# Altium footprint library heromap.PcbLib: 593 footprints (part 23 of 38)
Each footprint in its own frame and in the unit in brackets; x right, y up, seen from the top. Pads: shape width x height; smd on the part's side, far side on the other; paste and mask are expansions set on the pad; w line width, h text height; cw(c..) or ccw(c..) is an arc to the next point about the centre after c.
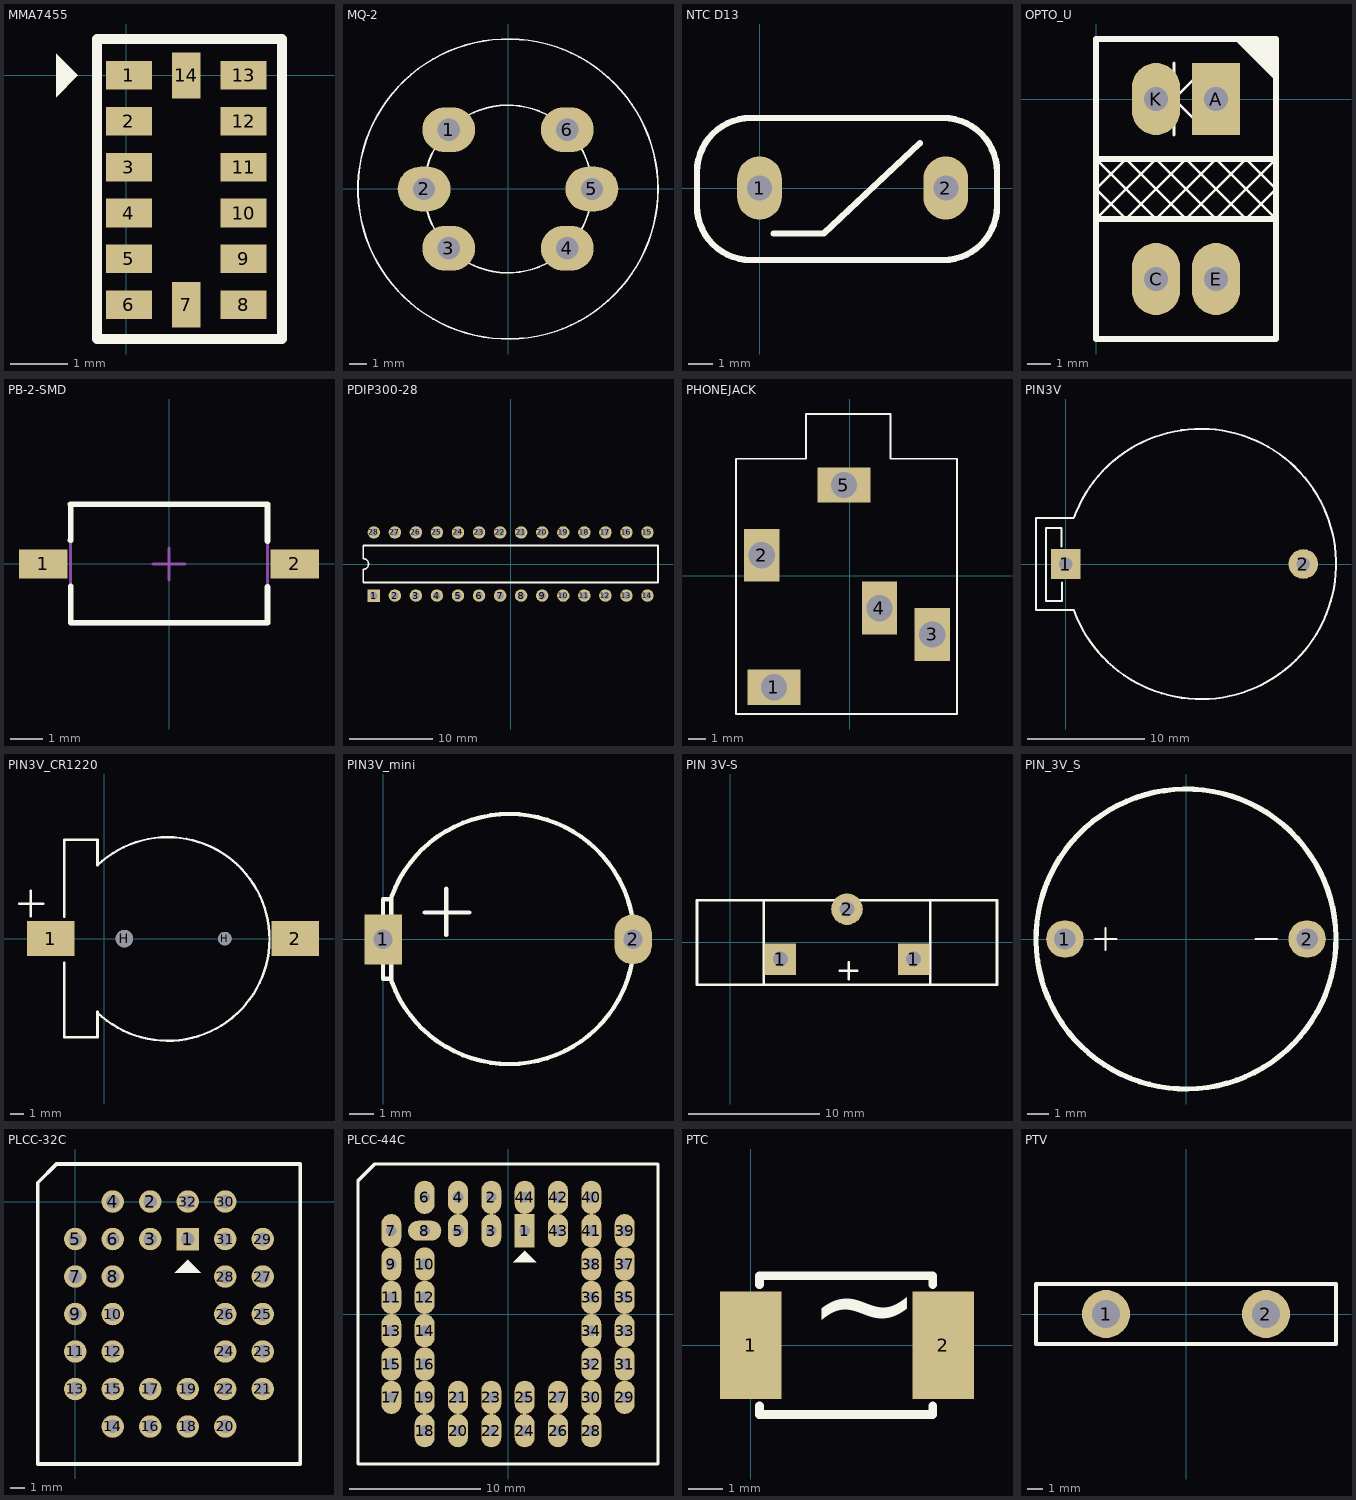
[diagram p22: the footprints below, top view; thin cyan lines are the x and y axes]

## MMA7455 [mm]
pads (14):
  rect 0.8x0.5 smd: 1(0.051,0) 2(0.051,-0.8) 3(0.051,-1.6) 4(0.051,-2.4) 5(0.051,-3.2) 6(0.051,-4) 8(2.051,-4) 9(2.051,-3.2) 10(2.051,-2.4) 11(2.051,-1.6) 12(2.051,-0.8) 13(2.051,0)
  rect 0.5x0.8 smd: 7(1.051,-4) 14(1.051,0)
Top Overlay:
  region: -1.219,0.381 -0.838,0 -1.219,-0.381
  lines w0.178: -0.508,-4.572 -0.508,0.635 2.718,0.635 2.718,-4.597 ; 2.718,-4.597 -0.508,-4.597 2.718,-4.597

## MQ-2 [mm] "MQ-2 GAS SENSOR"
height 20.32
pads (6):
  oval 3x2.54 hole 1.25: 1(-3.359,3.359) 2(-4.75,0) 3(-3.359,-3.359) 4(3.359,-3.359) 5(4.75,0) 6(3.359,3.359)
Top Overlay:
  circle w0.1: c0,0 r8.5
  circle w0.1: c0,0 r4.75
3D body: height 8.7, standoff 0.5, extent -4.762,-4.791 4.8,4.791
3D body: height 16.7, standoff 0.2, extent -4.713,-4.741 4.75,4.74
3D body: height 6.3, standoff 0.1, extent -8.433,-8.483 8.5,8.483
3D body: height 0.4, standoff -2.3, extent -3.855,2.86 -2.859,3.858
3D body: height 0.4, standoff -2.3, extent -5.258,-0.499 -4.262,0.499
3D body: height 0.4, standoff -2.3, extent -3.855,-3.858 -2.859,-2.86
3D body: height 0.4, standoff -2.3, extent 2.863,-3.858 3.859,-2.86
3D body: height 0.4, standoff -2.3, extent 4.254,-0.499 5.25,0.499
3D body: height 0.4, standoff -2.3, extent 2.863,2.86 3.859,3.858

## NTC D13 [mm]
pads (2):
  oval 1.8x2.54 hole 1: 1(0,0) 2(7.493,0)
Top Overlay:
  lines w0.254: 0.559,-1.829 2.591,-1.829 6.452,1.803 ; -2.515,-0.728 ccw(c-0.347,-0.728) -1.88,-2.261 ccw(c-0.347,-0.728) -0.347,-2.896 7.382,-2.896 ccw(c7.382,-0.728) 8.915,-2.261 ccw(c7.382,-0.728) 9.55,-0.728 9.55,0.651 ccw(c7.382,0.651) 8.915,2.184 ccw(c7.382,0.651) 7.382,2.819 0.025,2.819 -0.347,2.819 ccw(c-0.347,0.651) -1.88,2.184 ccw(c-0.347,0.651) -2.515,0.651 -2.515,-0.728
3D body "SW3dPS-B57237.STEP": height 27.5, standoff -24.48, extent -3.715,-3.52 11.285,3.48

## OPTO_U [mil] "Opto hinh chu U"
height 104.33
pads (4):
  rect 80x120 hole 40: A(200,0)
  oval 80x120 hole 40: C(100,-300) E(200,-300) K(100,0)
Top Overlay:
  region: 297.5,97.5 232.5,97.5 297.5,32.5
  lines w5: 0,-200 50,-150 100,-100 200,-200 230,-170 300,-100 300,-200 200,-100 100,-200 90,-190 60,-160 0,-100 ; 130,-60 130,60 ; 180,-50 180,50 ; 180,-50 180,50 ; 180,-50 130,0 180,50 ; 0,-150 30,-180 50,-200 150,-100 250,-200 300,-150 250,-100 150,-200 50,-100 0,-150
  lines w10: 0,-200 300,-200 ; 0,-150 0,-110 ; 0,-100 300,-100 ; 300,-150 300,-140 ; 0,-400 300,-400 300,100 0,100 0,-400
3D body "SW3dPS-optek opb620.STEP": height 374.02, standoff -100, extent 43.46,-346.85 260,46.85

## PB-2-SMD [mm]
height 3.7
pads (2):
  rect 1.5x0.9 smd: 1(-3.9,0) 2(3.9,0)
Top Overlay:
  lines w0.178: -3.05,0.737 -3.048,0.739 -3.048,1.85 ; -3.05,1.85 3.05,1.85 3.05,0.711 ; -3.048,-0.686 -3.048,-1.825 3.052,-1.825 ; 3.05,-1.825 3.05,-0.713 3.052,-0.711
Mechanical 13:
  lines w0.1: -3.048,-1.825 3.052,-1.825 ; -3.05,-1.85 -3.05,1.85 3.05,1.85 3.05,-1.85 -3.05,-1.85
Mechanical 15:
  lines w0.1: -0.5,0 0.5,0 ; 0,-0.5 0,0.5
3D body: height 0.2, standoff 0, extent 3.505,-0.356 4.343,0.356
3D body: height 0.95, standoff 0.75, extent 2.921,-0.356 3.759,0.356
3D body: height 0.95, standoff 0, extent 3.505,-0.356 3.759,0.356
3D body: height 0.95, standoff 0, extent -3.759,-0.356 -3.505,0.356
3D body: height 0.95, standoff 0.75, extent -3.759,-0.356 -2.921,0.356
3D body: height 0.2, standoff 0, extent -4.343,-0.356 -3.505,0.356
3D body: height 1.4, standoff 0, extent -3.05,-1.85 3.05,1.85
3D body: height 1.95, standoff 0.1, extent -2.31,-1.291 2.415,1.321
3D body: height 2.5, standoff 0.1, extent -1.841,-0.842 1.943,0.842

## PDIP300-28 [mm] "DIP, Plastic, Skinny; 28 Leads; Row Spacing 7.62 mm; Pitch 2.54 mm"
height 4.07
pads (28):
  rect 1.5x1.5 hole 0.9: 1(-16.51,-3.81)
  round 1.5 hole 0.9: 2(-13.97,-3.81) 3(-11.43,-3.81) 4(-8.89,-3.81) 5(-6.35,-3.81) 6(-3.81,-3.81) 7(-1.27,-3.81) 8(1.27,-3.81) 9(3.81,-3.81) 10(6.35,-3.81) 11(8.89,-3.81) 12(11.43,-3.81) 13(13.97,-3.81) 14(16.51,-3.81) 15(16.51,3.81) 16(13.97,3.81) 17(11.43,3.81) 18(8.89,3.81) 19(6.35,3.81) 20(3.81,3.81) 21(1.27,3.81) 22(-1.27,3.81) 23(-3.81,3.81) 24(-6.35,3.81) 25(-8.89,3.81) 26(-11.43,3.81) 27(-13.97,3.81) 28(-16.51,3.81)
Top Overlay:
  lines w0.2: -17.78,-2.225 -17.78,-0.635 ccw(c-17.78,0) -17.78,0.635 -17.78,2.225 17.78,2.225 17.78,-2.225 -17.78,-2.225

## PHONEJACK [mm]
pads (5):
  rect 3x2 hole 1.5: 1(-4.318,-6.35) 5(-0.34,5.151)
  rect 2x3 hole 1.5: 2(-5.013,1.15) 3(4.682,-3.35) 4(1.682,-1.85)
Top Overlay:
  lines w0.102: -6.477,-7.874 -6.477,6.65 -2.499,6.65 -2.499,9.19 0.381,9.19 2.302,9.19 2.302,6.65 6.096,6.65 6.096,-7.874 -6.477,-7.874
3D body: height 7.4, standoff 2.6, extent -2.498,6.651 2.283,9.151
3D body: height 10, standoff 0, extent -6.477,-7.874 6.096,6.731

## PIN3V [mil] "Socket PIN 3V 2032"
pads (2):
  rect 100x100 hole 45: 1(0,0)
  round 100 hole 45: 2(800,0)
Top Overlay:
  lines w7: -14,59 -14,121 -66,121 -66,-124 -13,-124 -13,-63 ; 26.33,155 -100,155 -100,-155 27.93,-155 ; 27.6,156.07 cw(c455,0) 27.93,-156.97
3D body "User Library-CR 2032 (Battery Holder)-1.STEP": height 277.56, standoff -137.8, extent -138.09,-451.83 991.83,443.83

## PIN3V_CR1220 [mm] "Socket PIN 3V CR1220"
pads (4):
  rect 3.54x2.6 smd: 1(-4,0.002) 2(14.25,0.002)
  round 1.3 hole 1.3: H(1.5,0)
  round 1 hole 1: H(9,0)
Top Overlay:
  lines w0.178: -6.364,2.592 -4.56,2.592 ; -5.5,1.678 -5.5,3.557 ; -3,-1.797 -3,-7.366 -0.5,-7.366 ; -3,1.625 -3,7.366 -0.5,7.366 ; -0.543,-5.502 ccw(c4.73,-0.033) -0.504,5.474
  lines w0.2: -0.508,5.461 -0.5,5.469 -0.5,7.366 ; -0.5,-7.366 -0.5,-5.469
3D body "User Library-cr1220.STEP": height 4.02, standoff -0.92, extent -4.25,-7.497 14.25,7.5

## PIN3V_mini [mil] "Socket PIN 3V"
pads (2):
  rect 60x80 hole 31: 1(0,0)
  oval 60x80 hole 31: 2(400,0)
Top Overlay:
  lines w7: 11,64 0,64 0,-63 13,-63 ; 13,-64 13,65 ; 14,-67.81 ccw(c201.94,0.6) 14,69 ; 67,43 138,43 ; 101,7 101,81

## PIN 3V-S [mil] "Socket PIN 3V"
pads (3):
  rect 95x95 hole 45: 1(150,-50) 1(550,-50)
  round 95 hole 45: 2(350,100)
Top Overlay:
  lines w8: 100,-127 100,127 ; 329,-85 380,-85 ; 355,-110 355,-60 ; 600,-127 600,127 ; -100,-127 -100,127 800,127 800,-127 -100,-127

## PIN_3V_S [mil]
pads (2):
  round 70 hole 40: 1(-226,0) 2(226,0)
Top Overlay:
  lines w4: -170,0 -130,0 ; -150,-20 -150,0 -150,20 ; 130,0 170,0
  lines w10: 279.07,22.83 ccw(c0,0) 279.14,21.9
3D body: height 118.11, standoff 0, extent -236.57,-236.57 236.57,236.57
3D body: height 117.72, standoff 0, extent -275,-275 276,275

## PLCC-32C [mil] "Socket PLCC32R"
height 200
pads (32):
  rect 60x60 hole 36: 1(300,-100)
  round 60 hole 36: 2(200,0) 3(200,-100) 4(100,0) 5(0,-100) 6(100,-100) 7(0,-200) 8(100,-200) 9(0,-300) 10(100,-300) 11(0,-400) 12(100,-400) 13(0,-500) 14(100,-600) 15(100,-500) 16(200,-600) 17(200,-500) 18(300,-600) 19(300,-500) 20(400,-600) 21(500,-500) 22(400,-500) 23(500,-400) 24(400,-400) 25(500,-300) 26(400,-300) 27(500,-200) 28(400,-200) 29(500,-100) 30(400,0) 31(400,-100) 32(300,0)
Top Overlay:
  region: 300,-155 265,-190 335,-190
  lines w10: -100,-700 600,-700 600,100 -50,100 -100,50 -100,-700

## PLCC-44C [mil] "QPC-44C"
height 200
pads (44):
  rect 60x100 hole 32: 1(50,250)
  oval 60x100 hole 32: 2(-50,350) 3(-50,250) 4(-150,350) 5(-150,250) 6(-250,350) 7(-350,250) 9(-350,150) 10(-250,150) 11(-350,50) 12(-250,50) 13(-350,-50) 14(-250,-50) 15(-350,-150) 16(-250,-150) 17(-350,-250) 18(-250,-350) 19(-250,-250) 20(-150,-350) 21(-150,-250) 22(-50,-350) 23(-50,-250) 24(50,-350) 25(50,-250) 26(150,-350) 27(150,-250) 28(250,-350) 29(350,-250) 30(250,-250) 31(350,-150) 32(250,-150) 33(350,-50) 34(250,-50) 35(350,50) 36(250,50) 37(350,150) 38(250,150) 39(350,250) 40(250,350) 41(250,250) 42(150,350) 43(150,250) 44(50,350)
  oval 100x60 hole 32: 8(-250,250)
Top Overlay:
  region: 50,190 15,155 85,155
  lines w10: -450,-450 -450,400 -400,450 450,450 450,-450 -450,-450

## PTC [mm] "PTC protec over curent"
pads (2):
  rect 1.8x3.15 smd: 1(0,0) 2(5.639,0)
Top Overlay:
  lines w0.254: 0.254,-1.778 0.254,-2.032 5.334,-2.032 5.334,-1.778 ; 0.254,1.778 0.254,2.032 5.334,2.032 5.334,1.778
  text "~" at 1.651,-1.143 h5
3D body "SW3dPS-Fuse 1812.STEP": height 1.03, standoff 0, extent 0.455,-1.74 5.19,1.74

## PTV [mil] "MOV protec over votage"
height 1181.1
pads (2):
  round 120 hole 70: 1(-200,0) 2(200,0)
Top Overlay:
  lines w10: -375,-75 -375,75 375,75 375,-75 -375,-75
3D body: height 669.29, standoff -118.11, extent 172.67,-27.5 227.56,27.51
3D body: height 669.29, standoff -118.11, extent -227.33,-27.5 -172.44,27.51
3D body: height 981.15, standoff 196.85, extent -392.85,-79.74 393,77.74